# Altium footprint library goldpin_female_pcb.PcbLib: 81 footprints (part 1 of 6)
Each footprint in its own frame and in the unit in brackets; x right, y up, seen from the top. Pads: shape width x height; smd on the part's side, far side on the other; paste and mask are expansions set on the pad; w line width, h text height; cw(c..) or ccw(c..) is an arc to the next point about the centre after c.
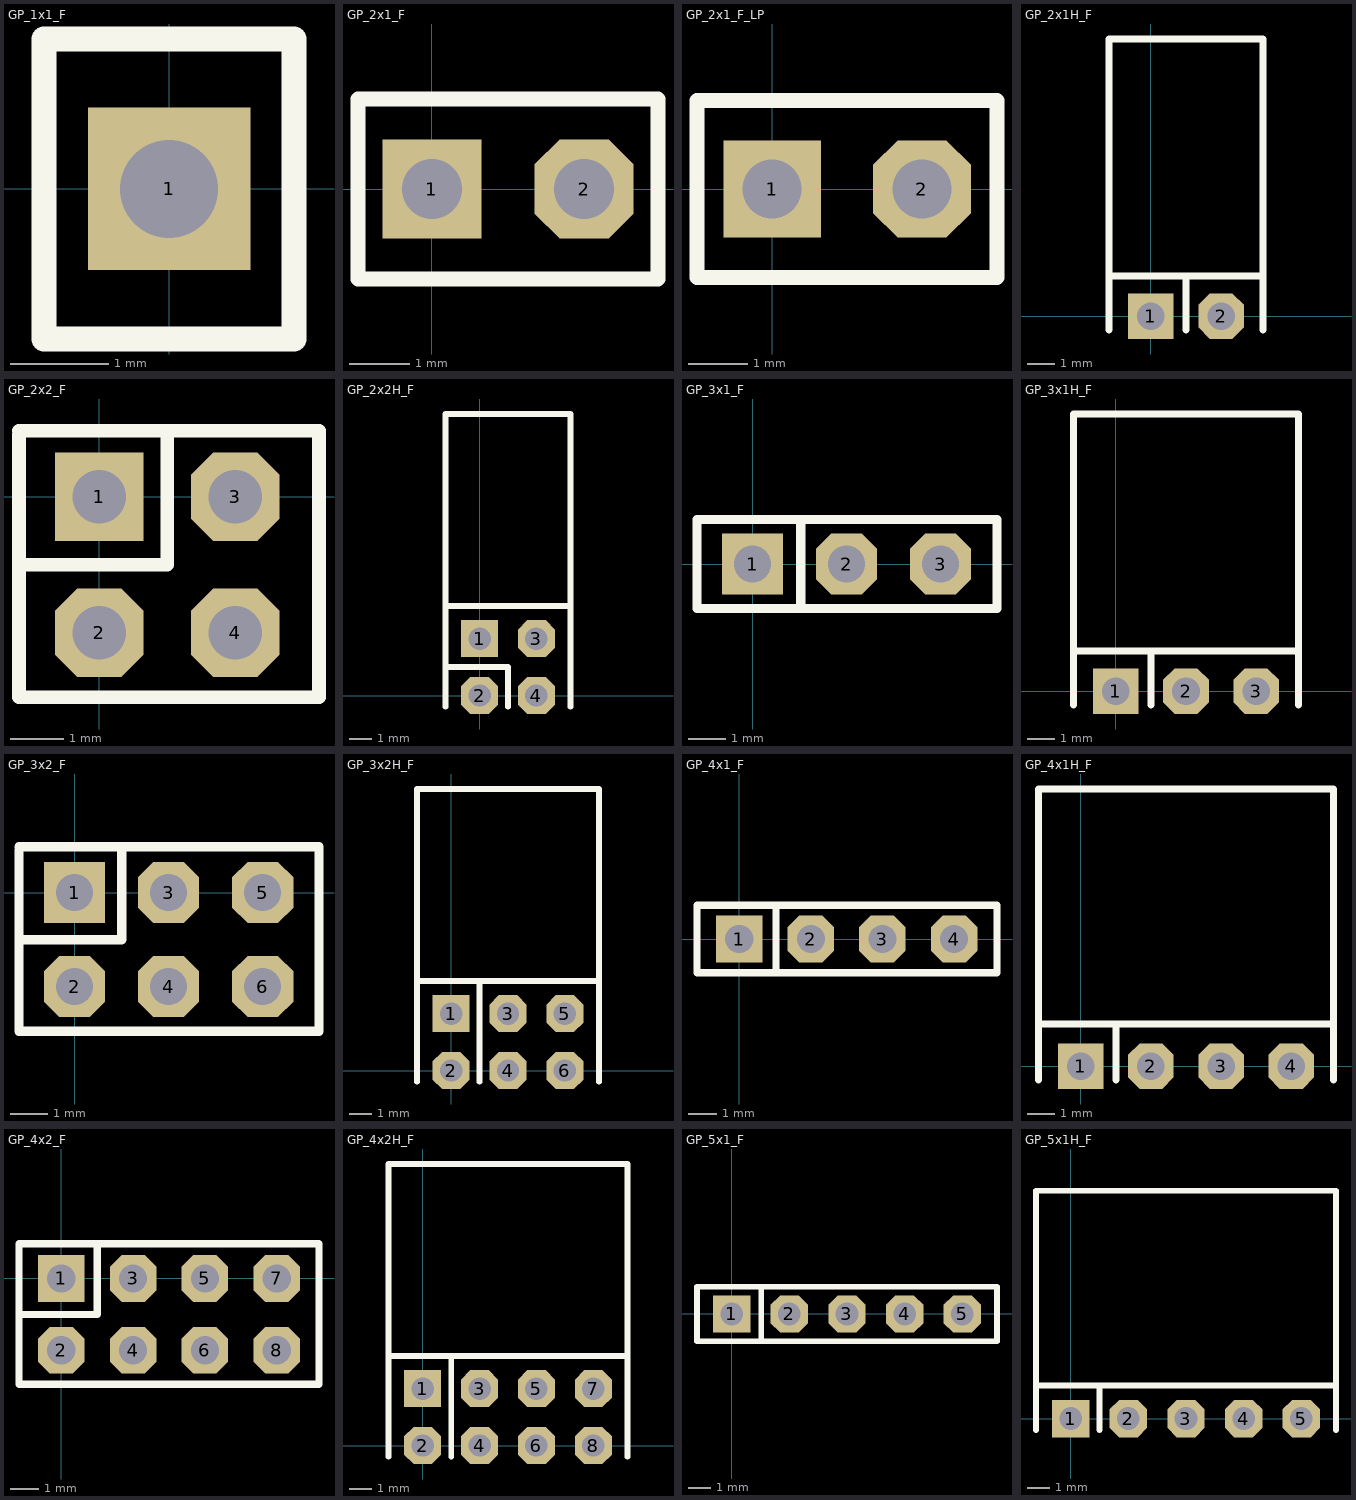
[diagram p0: the footprints below, top view; thin cyan lines are the x and y axes]

## GP_1x1_F [mil]
pads (1):
  rect 65x65 hole 39.37: 1(0,0)
Top Overlay:
  lines w10: -50,-60 -50,60 50,60 50,-60 -50,-60
3D body "Samtec-SSW-101-01-G-S.step": height 335.39, standoff -103.61, extent -47.5,-60 47.5,60

## GP_2x1_F [mil]
pads (2):
  rect 65x65 hole 39.37: 1(0,0)
  oct 65x65 hole 39.37: 2(100,0)
Top Overlay:
  lines w10: -48.43,-59.06 -48.43,59.06 148.43,59.06 148.43,-59.06 -48.43,-59.06
3D body "Samtec-SSW-101-01-G-D.step": height 335, standoff -104, extent -47.5,-60 147.5,60

## GP_2x1_F_LP [mil]
pads (2):
  rect 65x65 hole 39.37: 1(0,0)
  oct 65x65 hole 39.37: 2(100,0)
Top Overlay:
  lines w10: -50,-59.06 -50,-19.68 -50,59.06 150,59.06 150,-59.06 -50,-59.06
3D body "Samtec-CES-102-01-G-S.step": height 200.79, standoff -127.21, extent -50.79,-60 149.21,60

## GP_2x1H_F [mil]
pads (2):
  rect 65x65 hole 39.37: 1(0,0)
  oct 65x65 hole 39.37: 2(100,0)
Top Overlay:
  lines w10: -60,-20 -60,395 160,395 160,-19.68 ; -60,57.24 160,57.24 ; 50,-19.68 50,57.24
3D body "Samtec-SSW-102-22-G-S-RA.step": height 96.71, standoff -98.29, extent -60,-10 160,393

## GP_2x2_F [mil]
pads (4):
  rect 65x65 hole 39.37: 1(0,0)
  oct 65x65 hole 39.37: 2(0,-100) 3(100,0) 4(100,-100)
Top Overlay:
  lines w10: -59.06,-50 50,-50 50,48.45 ; -59.06,45.67 -59.06,-147.24 161.42,-147.24 161.42,48.45 -59.06,48.45
3D body "Samtec-SSW-102-01-G-D.step": height 335, standoff -104, extent -60.02,-147.51 159.98,47.49

## GP_2x2H_F [mil]
pads (4):
  rect 65x65 hole 39.37: 1(0,100)
  oct 65x65 hole 39.37: 2(0,0) 3(100,100) 4(100,0)
Top Overlay:
  lines w10: -60,-20 -60,495 160,495 160,-20 ; -60,50 50,50 50,-20 ; -60,157.24 160,157.24
3D body "Samtec-SSW-102-22-G-D-RA.step": height 197.89, standoff -97.11, extent -60,-10 160,493

## GP_3x1_F [mil]
pads (3):
  rect 65x65 hole 39.37: 1(0,0)
  oct 65x65 hole 39.37: 2(100,0) 3(200,0)
Top Overlay:
  lines w10: 51.18,-47.24 51.18,47.24 ; -59.06,-47.24 -59.06,-10.63 -59.06,47.51 260,47.51 260,-47.24 -59.06,-47.24
3D body "Samtec-SSW-103-01-G-S.step": height 335, standoff -104, extent -60,-47.49 260,47.51

## GP_3x1H_F [mil]
pads (3):
  rect 65x65 hole 39.37: 1(0,0)
  oct 65x65 hole 39.37: 2(100,0) 3(200,0)
Top Overlay:
  lines w10: -60,-20 -60,395 260,395 260,-19.68 ; -60,57.24 260,57.24 ; 50,-19.68 50,57.24
3D body "Samtec-SSW-103-22-G-S-RA.step": height 96.71, standoff -98.29, extent -60,-10 260,393

## GP_3x2_F [mil]
pads (6):
  rect 65x65 hole 39.37: 1(0,0)
  oct 65x65 hole 39.37: 2(0,-100) 3(100,0) 4(100,-100) 5(200,0) 6(200,-100)
Top Overlay:
  lines w10: -59.06,-50 50,-50 50,48.45 ; -59.06,45.67 -59.06,-147.24 259.84,-147.24 259.84,48.45 -59.06,48.45
3D body "Samtec-SSW-103-01-G-D.step": height 335, standoff -104, extent -60,-147.5 260,47.51

## GP_3x2H_F [mil]
pads (6):
  rect 65x65 hole 39.37: 1(0,100)
  oct 65x65 hole 39.37: 2(0,0) 3(100,100) 4(100,0) 5(200,100) 6(200,0)
Top Overlay:
  lines w10: -60,-20 -60,495 260,495 260,-20 ; -60,157.24 260,157.24 ; 50,-20 50,157.24
3D body "Samtec-SSW-103-22-G-D-RA.step": height 197.89, standoff -97.11, extent -60,-10 260,493

## GP_4x1_F [mil]
pads (4):
  rect 65x65 hole 39.37: 1(0,0)
  oct 65x65 hole 39.37: 2(100,0) 3(200,0) 4(300,0)
Top Overlay:
  lines w10: 51.18,-47.24 51.18,47.24 ; -59.06,-47.24 -59.06,47.24 360,47.24 360,-47.24 -59.06,-47.24
3D body "Samtec-SSW-104-01-G-S.step": height 335, standoff -104, extent -60,-47.49 360,47.51

## GP_4x1H_F [mil]
pads (4):
  rect 65x65 hole 39.37: 1(0,0)
  oct 65x65 hole 39.37: 2(100,0) 3(200,0) 4(300,0)
Top Overlay:
  lines w10: -60,-20 -60,395 360,395 360,-20 ; -55,60 360,60 ; 50,-19.68 50,60
3D body "Samtec-SSW-104-22-G-S-RA.step": height 96.71, standoff -98.29, extent -60,-10 360,393

## GP_4x2_F [mil]
pads (8):
  rect 65x65 hole 39.37: 1(0,0)
  oct 65x65 hole 39.37: 2(0,-100) 3(100,0) 4(100,-100) 5(200,0) 6(200,-100) 7(300,0) 8(300,-100)
Top Overlay:
  lines w10: -59.06,-50 50,-50 50,48.45 ; -59.06,-147.49 -59.06,48.45 359.06,48.45 359.06,-147.49 -59.06,-147.49
3D body "Samtec-SSW-104-01-G-D.step": height 335, standoff -104, extent -60,-147.49 360,47.51

## GP_4x2H_F [mil]
pads (8):
  rect 65x65 hole 39.37: 1(0,100)
  oct 65x65 hole 39.37: 2(0,0) 3(100,100) 4(100,0) 5(200,100) 6(200,0) 7(300,100) 8(300,0)
Top Overlay:
  lines w10: -60,-20 -60,495 360,495 360,-20 ; -60,157.24 358.27,157.24 ; 50,-20 50,157.24
3D body "Samtec-SSW-104-22-G-D-RA.step": height 197.89, standoff -97.11, extent -60,-10 360,493

## GP_5x1_F [mil]
pads (5):
  rect 65x65 hole 39.37: 1(0,0)
  oct 65x65 hole 39.37: 2(100,0) 3(200,0) 4(300,0) 5(400,0)
Top Overlay:
  lines w10: 51.18,-47.24 51.18,47.24 ; -60,-47.24 -60,47.24 460,47.24 460,-47.24 -60,-47.24
3D body "Samtec-SSW-105-01-G-S.step": height 335, standoff -104, extent -60,-47.5 460,47.51

## GP_5x1H_F [mil]
pads (5):
  rect 65x65 hole 39.37: 1(0,0)
  oct 65x65 hole 39.37: 2(100,0) 3(200,0) 4(300,0) 5(400,0)
Top Overlay:
  lines w10: -60,-20 -60,395 460,395 460,-20 ; -60,57.24 460,57.24 ; 50,-19.68 50,57.24
3D body "Samtec-SSW-105-22-G-S-RA.step": height 96.71, standoff -98.29, extent -60,-10 460,393